# Altium schematic symbol library LATTICEPLDS_Library.SchLib: 291 symbols (part 2 of 32) (continued)
## ispCLOCK5316S (continued)

## ispCLOCK5320S
designator U?  Data Sheet Version: October 2007
pins: 1 BANK_0A (out), 2 BANK_0B (out), 3 VCCO_1 (power), 4 BANK_1A (out), 5 BANK_1B (out), 6 GNDO_1 (power), 7 VCCO_2 (power), 8 BANK_2A (out), 9 BANK_2B (out), 10 GNDO_2 (power), 11 VCCO_3 (power), 12 BANK_3A (out), 13 BANK_3B (out), 14 GNDO_3 (power), 15 BANK_4A (out), 16 BANK_4B (out), 17 VCCO_4 (power), 18 GNDO_4 (power), 19 VTT_REFA (in), 20 REFA_REFP (in), 21 REFB_REFN (in), 22 VTT_REFB (in), 23 FBK (in), 24 VTT_FBK (in), 25 REFSEL (in), 26 RESET (in), 27 VCCD (power), 28 VCCD (power), 29 GNDD (power), 30 GNDD (power), 31 GNDO_5 (power), 32 VCCO_5 (power), 33 BANK_5B (out), 34 BANK_5A (out), 35 GNDO_6 (power), 36 BANK_6B (out), 37 BANK_6A (out), 38 VCCO_6 (power), 39 GNDO_7 (power), 40 BANK_7B (out), 41 BANK_7A (out), 42 VCCO_7 (power), 43 GNDO_8 (power), 44 BANK_8B (out), 45 BANK_8A (out), 46 VCCO_8 (power), 47 BANK_9B (out), 48 BANK_9A (out), 49 GNDO_9 (power), 50 VCCO_9 (power), 51 TDO (out), 52 TMS (in), 53 TCK (in), 54 TDI (in), 55 VCCJ (power), 56 OEY (in), 57 OEX (in), 58 PLL_BYPASS (in), 59 LOCK (out), 60 VCCA (power), 61 GNDA (power), 62 GNDD (power), 63 VCCO_0 (power), 64 GNDO_0 (power)

## ispCLOCK5610A
designator U?  Data Sheet Version: June 2008
pins: 1 VCCO_0 (power), 2 BANK_0B (out), 3 BANK_0A (out), 4 GNDO_0 (power), 5 VCCO_1 (power), 6 BANK_1B (out), 7 BANK_1A (out), 8 GNDO_1 (power), 9 VCCO_2 (power), 10 BANK_2B (out), 11 BANK_2A (out), 12 GNDO_2 (power), 13 VCCA (power), 14 GNDA (power), 15 FBKA+ (in), 16 FBKA- (in), 17 FBKVTT (in), 18 REFA+ (in), 19 REFA- (in), 20 REFVTT (in), 21 OEX (in), 22 OEY (in), 23 GNDD (power), 24 VCCD (power), 25 VCCO_3 (power), 26 BANK_3B (out), 27 BANK_3A (out), 28 GNDO_3 (power), 29 VCCO_4 (power), 30 BANK_4B (out), 31 BANK_4A (out), 32 GNDO_4 (power), 33 VCCD (power), 34 LOCK (out), 35 TDO (out), 36 VCCJ (power), 37 TMS (in), 38 TCK (in), 39 TDI (in), 40 SGATE (in), 41 RESET (in), 42 GOE (in), 43 PS1 (in), 44 PS0 (in), 45 TEST2 (in), 46 TEST1 (in), 47 PLL_BYPASS (in), 48 GNDD (power)

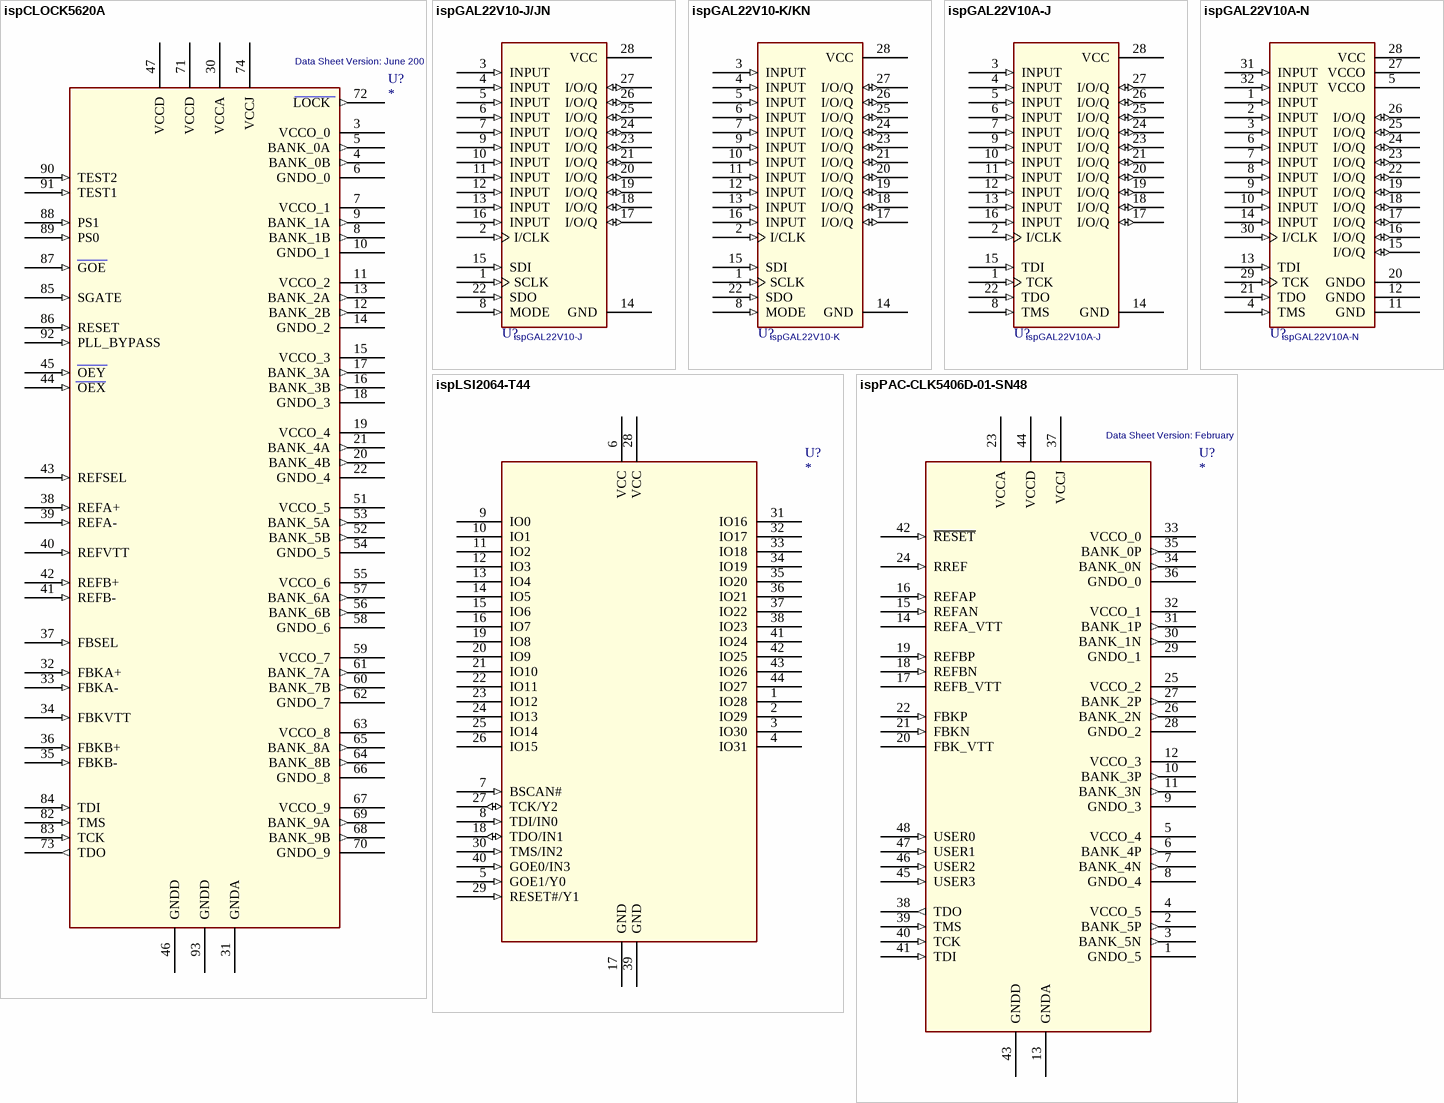
[diagram p18: symbols ispCLOCK5620A to ispPAC-CLK5406D-01-SN48]

## ispCLOCK5620A
designator U?  Data Sheet Version: June 2008
pins: 3 VCCO_0 (power), 4 BANK_0B (out), 5 BANK_0A (out), 6 GNDO_0 (power), 7 VCCO_1 (power), 8 BANK_1B (out), 9 BANK_1A (out), 10 GNDO_1 (power), 11 VCCO_2 (power), 12 BANK_2B (out), 13 BANK_2A (out), 14 GNDO_2 (power), 15 VCCO_3 (power), 16 BANK_3B (out), 17 BANK_3A (out), 18 GNDO_3 (power), 19 VCCO_4 (power), 20 BANK_4B (out), 21 BANK_4A (out), 22 GNDO_4 (power), 30 VCCA (power), 31 GNDA (power), 32 FBKA+ (in), 33 FBKA- (in), 34 FBKVTT (in), 35 FBKB- (in), 36 FBKB+ (in), 37 FBSEL (in), 38 REFA+ (in), 39 REFA- (in), 40 REFVTT (in), 41 REFB- (in), 42 REFB+ (in), 43 REFSEL (in), 44 OEX (in), 45 OEY (in), 46 GNDD (power), 47 VCCD (power), 51 VCCO_5 (power), 52 BANK_5B (out), 53 BANK_5A (out), 54 GNDO_5 (power), 55 VCCO_6 (power), 56 BANK_6B (out), 57 BANK_6A (out), 58 GNDO_6 (power), 59 VCCO_7 (power), 60 BANK_7B (out), 61 BANK_7A (out), 62 GNDO_7 (power), 63 VCCO_8 (power), 64 BANK_8B (out), 65 BANK_8A (out), 66 GNDO_8 (power), 67 VCCO_9 (power), 68 BANK_9B (out), 69 BANK_9A (out), 70 GNDO_9 (power), 71 VCCD (power), 72 LOCK (out), 73 TDO (out), 74 VCCJ (power), 82 TMS (in), 83 TCK (in), 84 TDI (in), 85 SGATE (in), 86 RESET (in), 87 GOE (in), 88 PS1 (in), 89 PS0 (in), 90 TEST2 (in), 91 TEST1 (in), 92 PLL_BYPASS (in), 93 GNDD (power)

## ispGAL22V10-J/JN
designator U?, comment ispGAL22V10-J
footprint DIP24
pins: 1 SCLK (in), 2 I/CLK (in), 3 INPUT (in), 4 INPUT (in), 5 INPUT (in), 6 INPUT (in), 7 INPUT (in), 8 MODE (in), 9 INPUT (in), 10 INPUT (in), 11 INPUT (in), 12 INPUT (in), 13 INPUT (in), 14 GND (power), 15 SDI (in), 16 INPUT (in), 17 I/O/Q (io), 18 I/O/Q (io), 19 I/O/Q (io), 20 I/O/Q (io), 21 I/O/Q (io), 22 SDO (in), 23 I/O/Q (io), 24 I/O/Q (io), 25 I/O/Q (io), 26 I/O/Q (io), 27 I/O/Q (io), 28 VCC (power)

## ispGAL22V10-K/KN
designator U?, comment ispGAL22V10-K
footprint DIP24
pins: 1 SCLK (in), 2 I/CLK (in), 3 INPUT (in), 4 INPUT (in), 5 INPUT (in), 6 INPUT (in), 7 INPUT (in), 8 MODE (in), 9 INPUT (in), 10 INPUT (in), 11 INPUT (in), 12 INPUT (in), 13 INPUT (in), 14 GND (power), 15 SDI (in), 16 INPUT (in), 17 I/O/Q (io), 18 I/O/Q (io), 19 I/O/Q (io), 20 I/O/Q (io), 21 I/O/Q (io), 22 SDO (in), 23 I/O/Q (io), 24 I/O/Q (io), 25 I/O/Q (io), 26 I/O/Q (io), 27 I/O/Q (io), 28 VCC (power)

## ispGAL22V10A-J
designator U?
footprint DIP24
pins: 1 TCK (in), 2 I/CLK (in), 3 INPUT (in), 4 INPUT (in), 5 INPUT (in), 6 INPUT (in), 7 INPUT (in), 8 TMS (in), 9 INPUT (in), 10 INPUT (in), 11 INPUT (in), 12 INPUT (in), 13 INPUT (in), 14 GND (power), 15 TDI (in), 16 INPUT (in), 17 I/O/Q (io), 18 I/O/Q (io), 19 I/O/Q (io), 20 I/O/Q (io), 21 I/O/Q (io), 22 TDO (in), 23 I/O/Q (io), 24 I/O/Q (io), 25 I/O/Q (io), 26 I/O/Q (io), 27 I/O/Q (io), 28 VCC (power)

## ispGAL22V10A-N
designator U?
footprint DIP24
pins: 1 INPUT (in), 2 INPUT (in), 3 INPUT (in), 4 TMS (in), 5 VCCO (power), 6 INPUT (in), 7 INPUT (in), 8 INPUT (in), 9 INPUT (in), 10 INPUT (in), 11 GND (power), 12 GNDO (power), 13 TDI (in), 14 INPUT (in), 15 I/O/Q (io), 16 I/O/Q (io), 17 I/O/Q (io), 18 I/O/Q (io), 19 I/O/Q (io), 20 GNDO (power), 21 TDO (in), 22 I/O/Q (io), 23 I/O/Q (io), 24 I/O/Q (io), 25 I/O/Q (io), 26 I/O/Q (io), 27 VCCO (power), 28 VCC (power), 29 TCK (in), 30 I/CLK (in), 31 INPUT (in), 32 INPUT (in)

## ispLSI2064-T44
designator U?
pins: 1 IO28 (hiz), 2 IO29 (hiz), 3 IO30 (hiz), 4 IO31 (hiz), 5 GOE1/Y0 (in), 6 VCC (power), 7 BSCAN# (in), 8 TDI/IN0 (in), 9 IO0 (hiz), 10 IO1 (hiz), 11 IO2 (hiz), 12 IO3 (hiz), 13 IO4 (hiz), 14 IO5 (hiz), 15 IO6 (hiz), 16 IO7 (hiz), 17 GND (power), 18 TDO/IN1 (io), 19 IO8 (hiz), 20 IO9 (hiz), 21 IO10 (hiz), 22 IO11 (hiz), 23 IO12 (hiz), 24 IO13 (hiz), 25 IO14 (hiz), 26 IO15 (hiz), 27 TCK/Y2 (io), 28 VCC (power), 29 RESET#/Y1 (in), 30 TMS/IN2 (in), 31 IO16 (hiz), 32 IO17 (hiz), 33 IO18 (hiz), 34 IO19 (hiz), 35 IO20 (hiz), 36 IO21 (hiz), 37 IO22 (hiz), 38 IO23 (hiz), 39 GND (power), 40 GOE0/IN3 (in), 41 IO24 (hiz), 42 IO25 (hiz), 43 IO26 (hiz), 44 IO27 (hiz)

## ispPAC-CLK5406D-01-SN48
designator U?  Data Sheet Version: February 2009
pins: 1 GNDO_5, 2 BANK_5P (out), 3 BANK_5N (out), 4 VCCO_5, 5 VCCO_4, 6 BANK_4P (out), 7 BANK_4N (out), 8 GNDO_4, 9 GNDO_3, 10 BANK_3P (out), 11 BANK_3N (out), 12 VCCO_3, 13 GNDA, 14 REFA_VTT, 15 REFAN (in), 16 REFAP (in), 17 REFB_VTT, 18 REFBN (in), 19 REFBP (in), 20 FBK_VTT, 21 FBKN (in), 22 FBKP (in), 23 VCCA, 24 RREF (in), 25 VCCO_2, 26 BANK_2N (out), 27 BANK_2P (out), 28 GNDO_2, 29 GNDO_1, 30 BANK_1N (out), 31 BANK_1P (out), 32 VCCO_1, 33 VCCO_0, 34 BANK_0N (out), 35 BANK_0P (out), 36 GNDO_0, 37 VCCJ, 38 TDO (out), 39 TMS (in), 40 TCK (in), 41 TDI (in), 42 ~{RESET} (in), 43 GNDD, 44 VCCD, 45 USER3 (in), 46 USER2 (in), 47 USER1 (in), 48 USER0 (in)

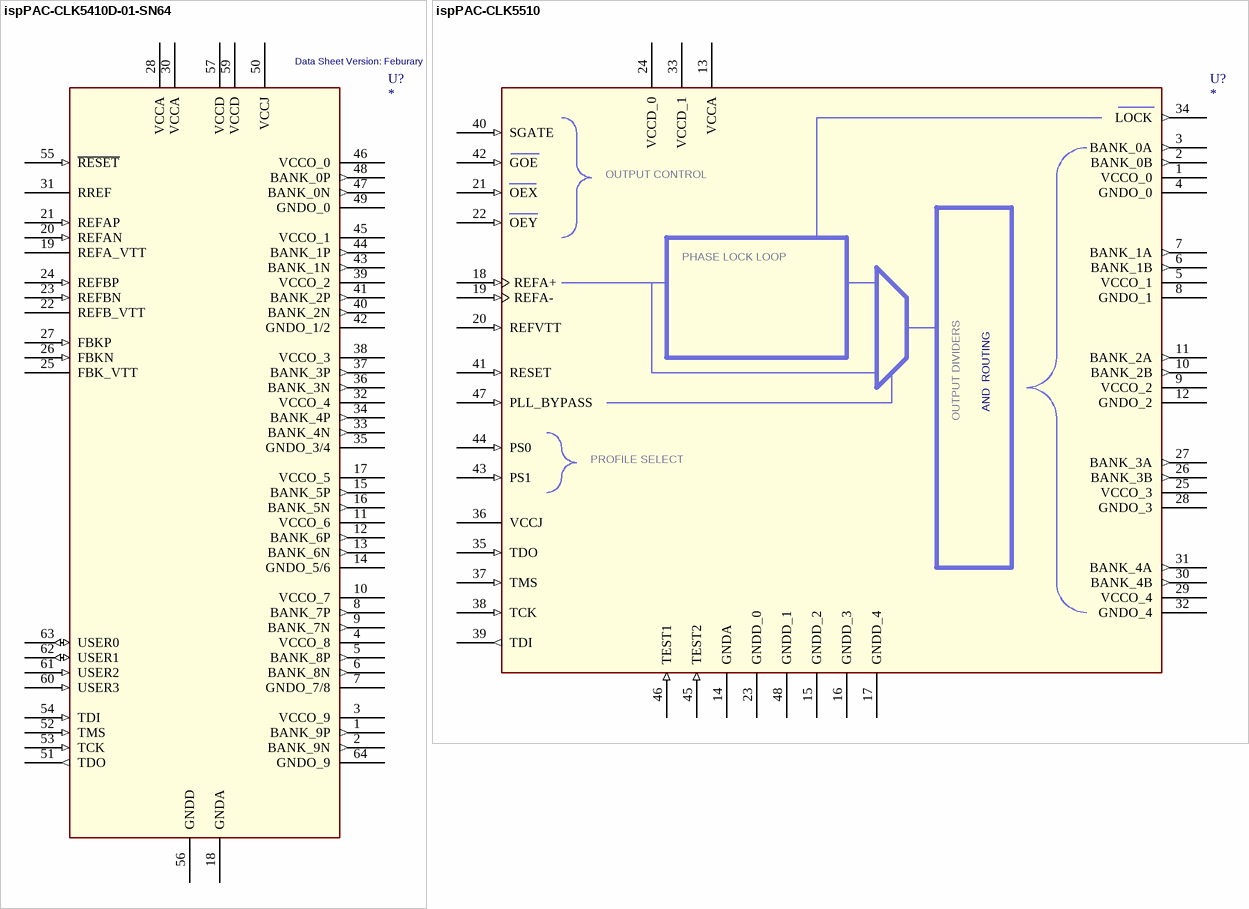
[diagram p19: symbols ispPAC-CLK5410D-01-SN64 to ispPAC-CLK5510]

## ispPAC-CLK5410D-01-SN64
designator U?  Data Sheet Version: Feburary 2009
pins: 1 BANK_9P (out), 2 BANK_9N (out), 3 VCCO_9, 4 VCCO_8, 5 BANK_8P (out), 6 BANK_8N (out), 7 GNDO_7/8, 8 BANK_7P (out), 9 BANK_7N (out), 10 VCCO_7, 11 VCCO_6, 12 BANK_6P (out), 13 BANK_6N (out), 14 GNDO_5/6, 15 BANK_5P (out), 16 BANK_5N (out), 17 VCCO_5, 18 GNDA, 19 REFA_VTT, 20 REFAN (in), 21 REFAP (in), 22 REFB_VTT, 23 REFBN (in), 24 REFBP (in), 25 FBK_VTT, 26 FBKN (in), 27 FBKP (in), 28 VCCA, 30 VCCA, 31 RREF, 32 VCCO_4, 33 BANK_4N (out), 34 BANK_4P (out), 35 GNDO_3/4, 36 BANK_3N (out), 37 BANK_3P (out), 38 VCCO_3, 39 VCCO_2, 40 BANK_2N (out), 41 BANK_2P (out), 42 GNDO_1/2, 43 BANK_1N (out), 44 BANK_1P (out), 45 VCCO_1, 46 VCCO_0, 47 BANK_0N (out), 48 BANK_0P (out), 49 GNDO_0, 50 VCCJ, 51 TDO (out), 52 TMS (in), 53 TCK (in), 54 TDI (in), 55 ~{RESET} (in), 56 GNDD, 57 VCCD, 59 VCCD, 60 USER3 (in), 61 USER2 (in), 62 USER1 (io), 63 USER0 (io), 64 GNDO_9

## ispPAC-CLK5510
designator U?
pins: 1 VCCO_0 (power), 2 BANK_0B (out), 3 BANK_0A (out), 4 GNDO_0 (power), 5 VCCO_1 (power), 6 BANK_1B (out), 7 BANK_1A (out), 8 GNDO_1 (power), 9 VCCO_2 (power), 10 BANK_2B (out), 11 BANK_2A (out), 12 GNDO_2 (power), 13 VCCA (power), 14 GNDA (power), 15 GNDD_2 (power), 16 GNDD_3 (power), 17 GNDD_4 (power), 18 REFA+ (in), 19 REFA- (in), 20 REFVTT (in), 21 OEX (in), 22 OEY (in), 23 GNDD_0 (power), 24 VCCD_0 (power), 25 VCCO_3 (power), 26 BANK_3B (out), 27 BANK_3A (out), 28 GNDO_3 (power), 29 VCCO_4 (power), 30 BANK_4B (out), 31 BANK_4A (out), 32 GNDO_4 (power), 33 VCCD_1 (power), 34 LOCK (out), 35 TDO (in), 36 VCCJ (power), 37 TMS (in), 38 TCK (in), 39 TDI (out), 40 SGATE (in), 41 RESET (in), 42 GOE (in), 43 PS1 (in), 44 PS0 (in), 45 TEST2 (in), 46 TEST1 (in), 47 PLL_BYPASS (in), 48 GNDD_1 (power)
text: OUTPUT CONTROL; PHASE LOCK LOOP; AND  ROUTING; OUTPUT DIVIDERS; PROFILE SELECT

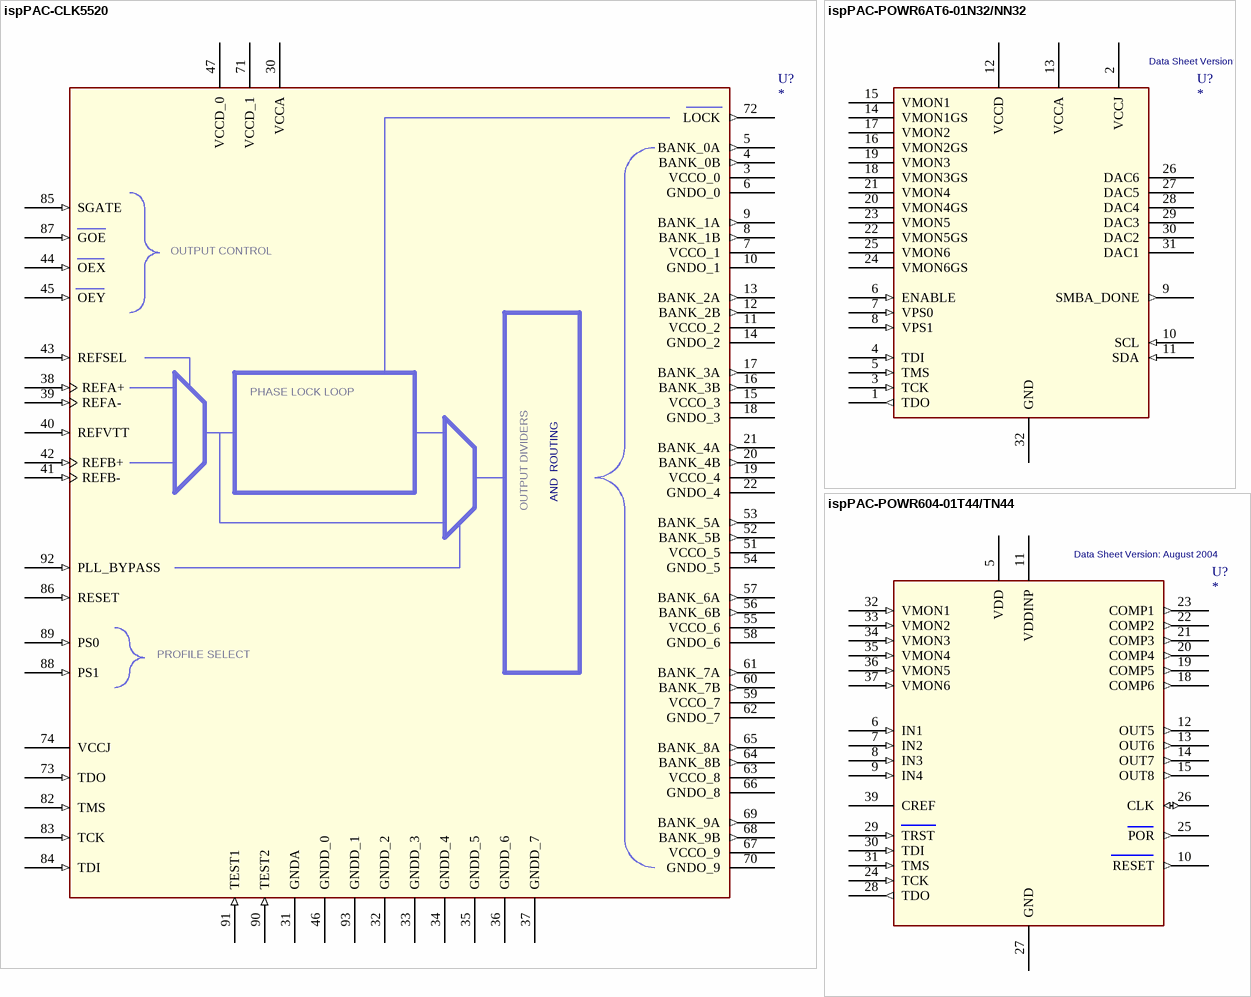
[diagram p20: symbols ispPAC-CLK5520 to ispPAC-POWR604-01T44/TN44]

## ispPAC-CLK5520
designator U?
pins: 3 VCCO_0 (power), 4 BANK_0B (out), 5 BANK_0A (out), 6 GNDO_0 (power), 7 VCCO_1 (power), 8 BANK_1B (out), 9 BANK_1A (out), 10 GNDO_1 (power), 11 VCCO_2 (power), 12 BANK_2B (out), 13 BANK_2A (out), 14 GNDO_2 (power), 15 VCCO_3 (power), 16 BANK_3B (out), 17 BANK_3A (out), 18 GNDO_3 (power), 19 VCCO_4 (power), 20 BANK_4B (out), 21 BANK_4A (out), 22 GNDO_4 (power), 30 VCCA (power), 31 GNDA (power), 32 GNDD_2 (power), 33 GNDD_3 (power), 34 GNDD_4 (power), 35 GNDD_5 (power), 36 GNDD_6 (power), 37 GNDD_7 (power), 38 REFA+ (in), 39 REFA- (in), 40 REFVTT (in), 41 REFB- (in), 42 REFB+ (in), 43 REFSEL (in), 44 OEX (in), 45 OEY (in), 46 GNDD_0 (power), 47 VCCD_0 (power), 51 VCCO_5 (power), 52 BANK_5B (out), 53 BANK_5A (out), 54 GNDO_5 (power), 55 VCCO_6 (power), 56 BANK_6B (out), 57 BANK_6A (out), 58 GNDO_6 (power), 59 VCCO_7 (power), 60 BANK_7B (out), 61 BANK_7A (out), 62 GNDO_7 (power), 63 VCCO_8 (power), 64 BANK_8B (out), 65 BANK_8A (out), 66 GNDO_8 (power), 67 VCCO_9 (power), 68 BANK_9B (out), 69 BANK_9A (out), 70 GNDO_9 (power), 71 VCCD_1 (power), 72 LOCK (out), 73 TDO (in), 74 VCCJ (power), 82 TMS (in), 83 TCK (in), 84 TDI (in), 85 SGATE (in), 86 RESET (in), 87 GOE (in), 88 PS1 (in), 89 PS0 (in), 90 TEST2 (in), 91 TEST1 (in), 92 PLL_BYPASS (in), 93 GNDD_1 (power)
text: OUTPUT CONTROL; PHASE LOCK LOOP; AND  ROUTING; OUTPUT DIVIDERS; PROFILE SELECT

## ispPAC-POWR6AT6-01N32/NN32
designator U?  Data Sheet Version: April 2007
pins: 1 TDO (out), 2 VCCJ (power), 3 TCK (in), 4 TDI (in), 5 TMS (in), 6 ENABLE (in), 7 VPS0 (in), 8 VPS1 (in), 9 SMBA_DONE (out), 10 SCL (in), 11 SDA (in), 12 VCCD (power), 13 VCCA (power), 14 VMON1GS, 15 VMON1, 16 VMON2GS, 17 VMON2, 18 VMON3GS, 19 VMON3, 20 VMON4GS, 21 VMON4, 22 VMON5GS, 23 VMON5, 24 VMON6GS, 25 VMON6, 26 DAC6, 27 DAC5, 28 DAC4, 29 DAC3, 30 DAC2, 31 DAC1, 32 GND (power)

## ispPAC-POWR604-01T44/TN44
designator U?  Data Sheet Version: August 2004
pins: 5 VDD (power), 6 IN1 (in), 7 IN2 (in), 8 IN3 (in), 9 IN4 (in), 10 RESET (out), 11 VDDINP (power), 12 OUT5 (out), 13 OUT6 (out), 14 OUT7 (out), 15 OUT8 (out), 18 COMP6 (out), 19 COMP5 (out), 20 COMP4 (out), 21 COMP3 (out), 22 COMP2 (out), 23 COMP1 (out), 24 TCK (in), 25 POR (out), 26 CLK (io), 27 GND (power), 28 TDO (out), 29 TRST (in), 30 TDI (in), 31 TMS (in), 32 VMON1 (in), 33 VMON2 (in), 34 VMON3 (in), 35 VMON4 (in), 36 VMON5 (in), 37 VMON6 (in), 39 CREF

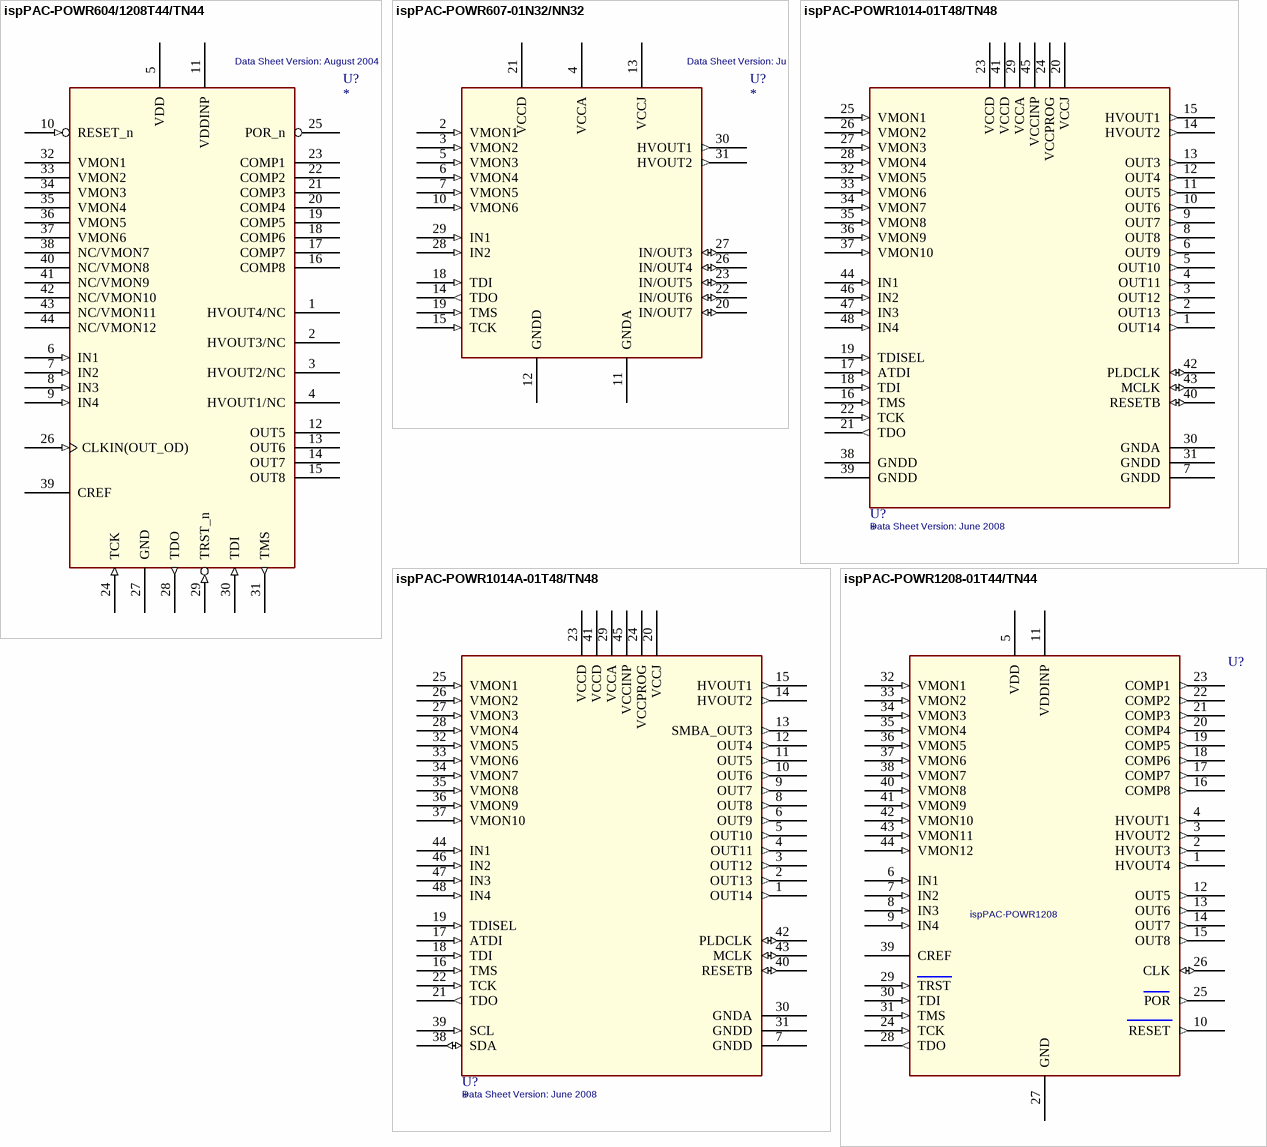
[diagram p21: symbols ispPAC-POWR604/1208T44/TN44 to ispPAC-POWR1208-01T44/TN44]

## ispPAC-POWR604/1208T44/TN44
designator U?  Data Sheet Version: August 2004
pins: 1 HVOUT4/NC (oc), 2 HVOUT3/NC (oc), 3 HVOUT2/NC (oc), 4 HVOUT1/NC (oc), 5 VDD (power), 6 IN1 (in), 7 IN2 (in), 8 IN3 (in), 9 IN4 (in), 10 RESET_n (in), 11 VDDINP (power), 12 OUT5 (oc), 13 OUT6 (oc), 14 OUT7 (oc), 15 OUT8 (oc), 16 COMP8 (oc), 17 COMP7 (oc), 18 COMP6 (oc), 19 COMP5 (oc), 20 COMP4 (oc), 21 COMP3 (oc), 22 COMP2 (oc), 23 COMP1 (oc), 24 TCK (in), 25 POR_n (oc), 26 CLKIN(OUT_OD) (in), 27 GND (power), 28 TDO (out), 29 TRST_n (in), 30 TDI (in), 31 TMS (out), 32 VMON1, 33 VMON2, 34 VMON3, 35 VMON4, 36 VMON5, 37 VMON6, 38 NC/VMON7, 39 CREF, 40 NC/VMON8, 41 NC/VMON9, 42 NC/VMON10, 43 NC/VMON11, 44 NC/VMON12

## ispPAC-POWR607-01N32/NN32
designator U?  Data Sheet Version: June 2008
footprint 32QFN
pins: 2 VMON1 (in), 3 VMON2 (in), 4 VCCA (power), 5 VMON3 (in), 6 VMON4 (in), 7 VMON5 (in), 10 VMON6 (in), 11 GNDA (power), 12 GNDD (power), 13 VCCJ (power), 14 TDO (out), 15 TCK (in), 18 TDI (in), 19 TMS (in), 20 IN/OUT7 (io), 21 VCCD (power), 22 IN/OUT6 (io), 23 IN/OUT5 (io), 26 IN/OUT4 (io), 27 IN/OUT3 (io), 28 IN2 (in), 29 IN1 (in), 30 HVOUT1 (out), 31 HVOUT2 (out)

## ispPAC-POWR1014-01T48/TN48
designator U?  Data Sheet Version: June 2008
footprint TQFP_48
pins: 1 OUT14 (out), 2 OUT13 (out), 3 OUT12 (out), 4 OUT11 (out), 5 OUT10 (out), 6 OUT9 (out), 7 GNDD (power), 8 OUT8 (out), 9 OUT7 (out), 10 OUT6 (out), 11 OUT5 (out), 12 OUT4 (out), 13 OUT3 (out), 14 HVOUT2 (out), 15 HVOUT1 (out), 16 TMS (in), 17 ATDI (in), 18 TDI (in), 19 TDISEL (in), 20 VCCJ (power), 21 TDO (out), 22 TCK (in), 23 VCCD (power), 24 VCCPROG (power), 25 VMON1 (in), 26 VMON2 (in), 27 VMON3 (in), 28 VMON4 (in), 29 VCCA (power), 30 GNDA (power), 31 GNDD (power), 32 VMON5 (in), 33 VMON6 (in), 34 VMON7 (in), 35 VMON8 (in), 36 VMON9 (in), 37 VMON10 (in), 38 GNDD (power), 39 GNDD (power), 40 RESETB (io), 41 VCCD (power), 42 PLDCLK (io), 43 MCLK (io), 44 IN1 (in), 45 VCCINP (power), 46 IN2 (in), 47 IN3 (in), 48 IN4 (in)

## ispPAC-POWR1014A-01T48/TN48
designator U?  Data Sheet Version: June 2008
pins: 1 OUT14 (out), 2 OUT13 (out), 3 OUT12 (out), 4 OUT11 (out), 5 OUT10 (out), 6 OUT9 (out), 7 GNDD (power), 8 OUT8 (out), 9 OUT7 (out), 10 OUT6 (out), 11 OUT5 (out), 12 OUT4 (out), 13 SMBA_OUT3 (out), 14 HVOUT2 (out), 15 HVOUT1 (out), 16 TMS (in), 17 ATDI (in), 18 TDI (in), 19 TDISEL (in), 20 VCCJ (power), 21 TDO (out), 22 TCK (in), 23 VCCD (power), 24 VCCPROG (power), 25 VMON1 (in), 26 VMON2 (in), 27 VMON3 (in), 28 VMON4 (in), 29 VCCA (power), 30 GNDA (power), 31 GNDD (power), 32 VMON5 (in), 33 VMON6 (in), 34 VMON7 (in), 35 VMON8 (in), 36 VMON9 (in), 37 VMON10 (in), 38 SDA (io), 39 SCL (in), 40 RESETB (io), 41 VCCD (power), 42 PLDCLK (io), 43 MCLK (io), 44 IN1 (in), 45 VCCINP (power), 46 IN2 (in), 47 IN3 (in), 48 IN4 (in)

## ispPAC-POWR1208-01T44/TN44
designator U?, comment ispPAC-POWR1208
pins: 1 HVOUT4 (out), 2 HVOUT3 (out), 3 HVOUT2 (out), 4 HVOUT1 (out), 5 VDD (power), 6 IN1 (in), 7 IN2 (in), 8 IN3 (in), 9 IN4 (in), 10 RESET (out), 11 VDDINP (power), 12 OUT5 (out), 13 OUT6 (out), 14 OUT7 (out), 15 OUT8 (out), 16 COMP8 (out), 17 COMP7 (out), 18 COMP6 (out), 19 COMP5 (out), 20 COMP4 (out), 21 COMP3 (out), 22 COMP2 (out), 23 COMP1 (out), 24 TCK (in), 25 POR (out), 26 CLK (io), 27 GND (power), 28 TDO (out), 29 TRST (in), 30 TDI (in), 31 TMS (in), 32 VMON1 (in), 33 VMON2 (in), 34 VMON3 (in), 35 VMON4 (in), 36 VMON5 (in), 37 VMON6 (in), 38 VMON7 (in), 39 CREF, 40 VMON8 (in), 41 VMON9 (in), 42 VMON10 (in), 43 VMON11 (in), 44 VMON12 (in)

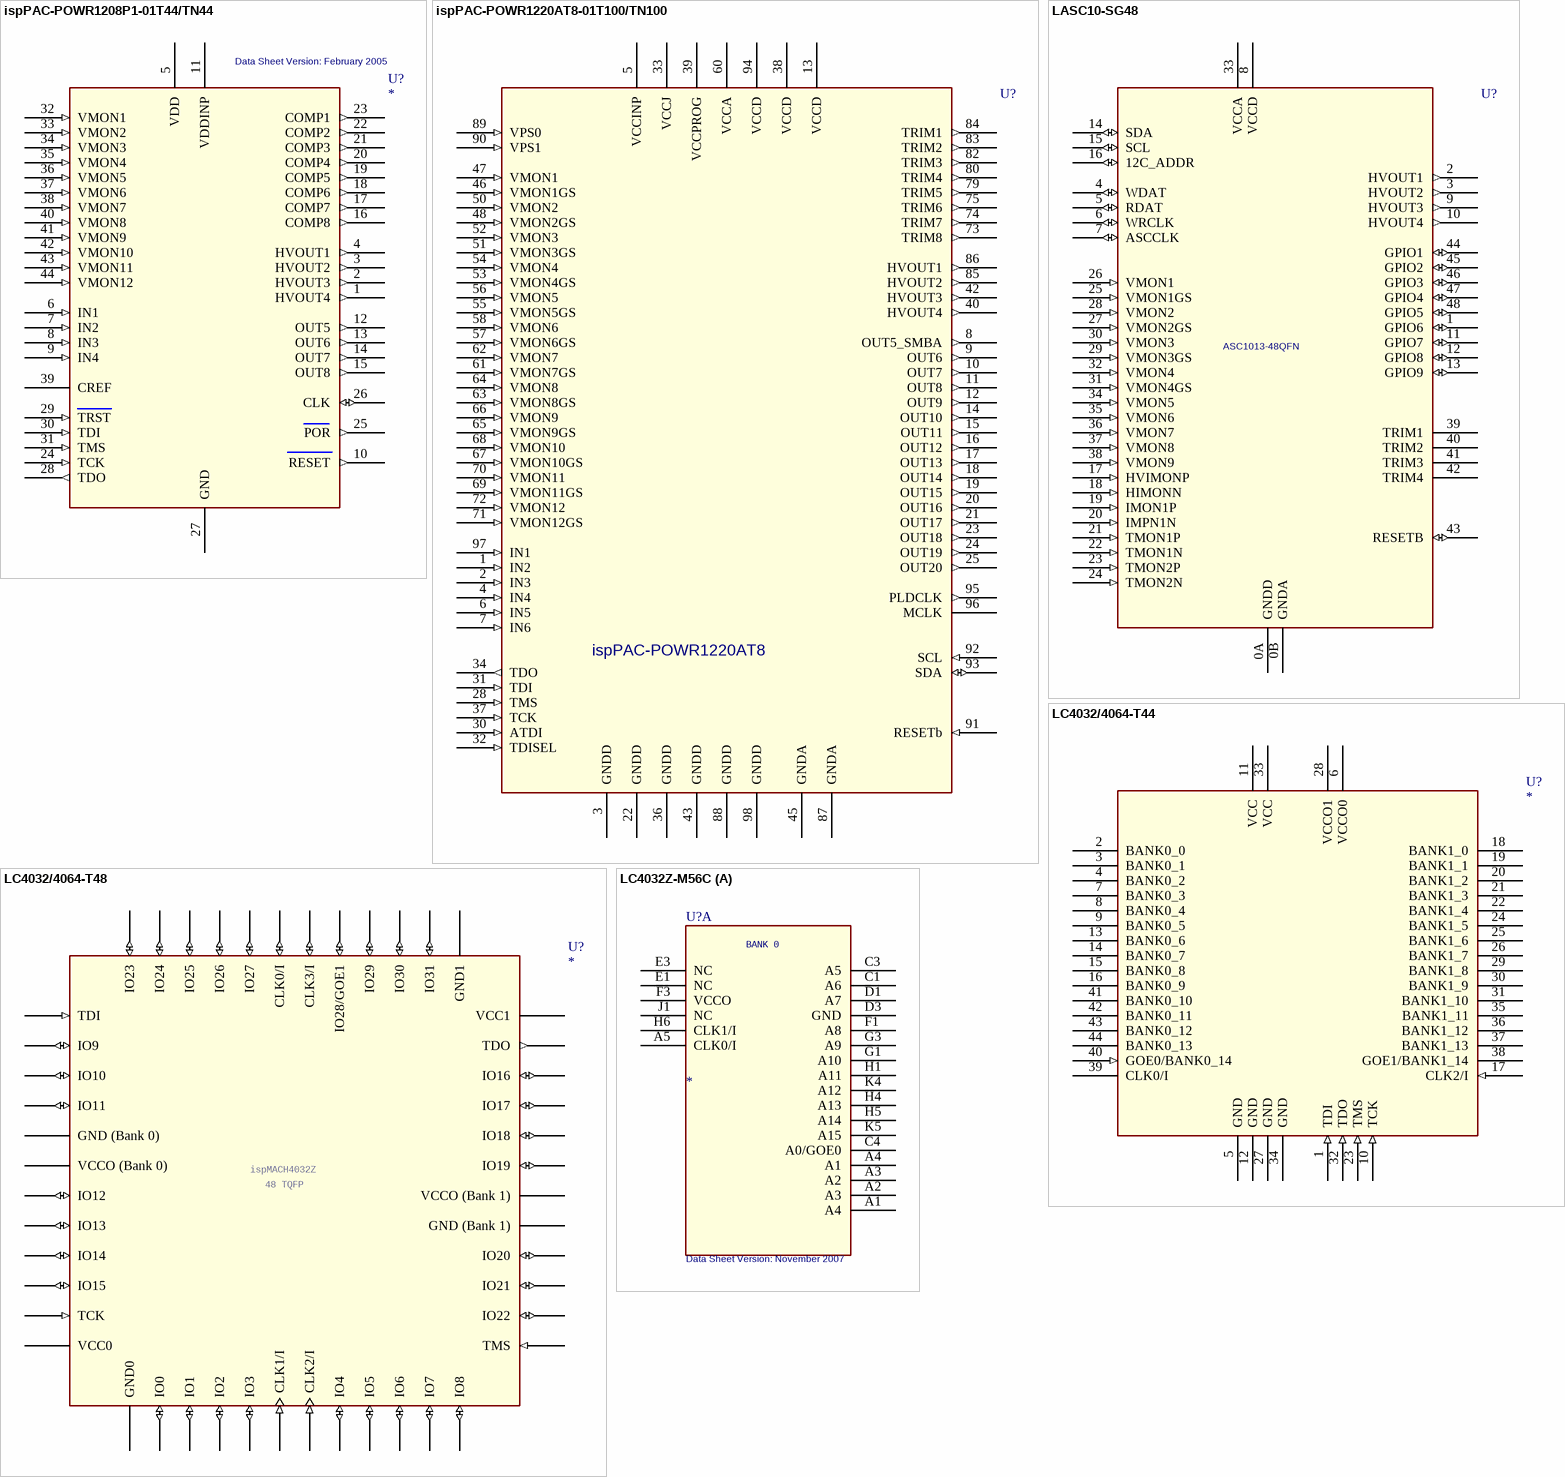
[diagram p22: symbols ispPAC-POWR1208P1-01T44/TN44 to LC4032Z-M56C]

## ispPAC-POWR1208P1-01T44/TN44
designator U?  Data Sheet Version: February 2005
pins: 1 HVOUT4 (out), 2 HVOUT3 (out), 3 HVOUT2 (out), 4 HVOUT1 (out), 5 VDD (power), 6 IN1 (in), 7 IN2 (in), 8 IN3 (in), 9 IN4 (in), 10 RESET (out), 11 VDDINP (power), 12 OUT5 (out), 13 OUT6 (out), 14 OUT7 (out), 15 OUT8 (out), 16 COMP8 (out), 17 COMP7 (out), 18 COMP6 (out), 19 COMP5 (out), 20 COMP4 (out), 21 COMP3 (out), 22 COMP2 (out), 23 COMP1 (out), 24 TCK (in), 25 POR (out), 26 CLK (io), 27 GND (power), 28 TDO (out), 29 TRST (in), 30 TDI (in), 31 TMS (in), 32 VMON1 (in), 33 VMON2 (in), 34 VMON3 (in), 35 VMON4 (in), 36 VMON5 (in), 37 VMON6 (in), 38 VMON7 (in), 39 CREF, 40 VMON8 (in), 41 VMON9 (in), 42 VMON10 (in), 43 VMON11 (in), 44 VMON12 (in)

## ispPAC-POWR1220AT8-01T100/TN100
designator U?, comment ispPAC-POWR1220AT8
pins: 1 IN2 (in), 2 IN3 (in), 3 GNDD (power), 4 IN4 (in), 5 VCCINP (power), 6 IN5 (in), 7 IN6 (in), 8 OUT5_SMBA (out), 9 OUT6 (out), 10 OUT7 (out), 11 OUT8 (out), 12 OUT9 (out), 13 VCCD (power), 14 OUT10 (out), 15 OUT11 (out), 16 OUT12 (out), 17 OUT13 (out), 18 OUT14 (out), 19 OUT15 (out), 20 OUT16 (out), 21 OUT17 (out), 22 GNDD (power), 23 OUT18 (out), 24 OUT19 (out), 25 OUT20 (out), 28 TMS (in), 30 ATDI (in), 31 TDI (in), 32 TDISEL (in), 33 VCCJ (power), 34 TDO (out), 36 GNDD (power), 37 TCK (in), 38 VCCD (power), 39 VCCPROG (power), 40 HVOUT4 (out), 42 HVOUT3 (out), 43 GNDD (power), 45 GNDA (power), 46 VMON1GS (in), 47 VMON1 (in), 48 VMON2GS (in), 50 VMON2 (in), 51 VMON3GS (in), 52 VMON3 (in), 53 VMON4GS (in), 54 VMON4 (in), 55 VMON5GS (in), 56 VMON5 (in), 57 VMON6GS (in), 58 VMON6 (in), 60 VCCA (power), 61 VMON7GS (in), 62 VMON7 (in), 63 VMON8GS (in), 64 VMON8 (in), 65 VMON9GS (in), 66 VMON9 (in), 67 VMON10GS (in), 68 VMON10 (in), 69 VMON11GS (in), 70 VMON11 (in), 71 VMON12GS (in), 72 VMON12 (in), 73 TRIM8 (out), 74 TRIM7 (out), 75 TRIM6 (out), 79 TRIM5 (out), 80 TRIM4 (out), 82 TRIM3 (out), 83 TRIM2 (out), 84 TRIM1 (out), 85 HVOUT2 (out), 86 HVOUT1 (out), 87 GNDA (power), 88 GNDD (power), 89 VPS0 (in), 90 VPS1 (in), 91 RESETb (in), 92 SCL (in), 93 SDA (io), 94 VCCD (power), 95 PLDCLK (out), 96 MCLK (hiz), 97 IN1 (in), 98 GNDD (power)